# Altium schematic symbol library jlcpcb_2025_04_capacitors_extended_1206.schlib: 2503 symbols (part 7 of 14) (continued)
## CC1206JRNPOBBN680 (continued)

## CC1206JRNPOBBN681
designator C?  Capacitance: 680pF  (hidden comment: *)
Capacitor, Ceramic (MLCC), 680pF, ±5%, 500V, NP0, ±5%, SMD 1206; Manufacturer: YAGEO; Manufacturer Part Number: CC1206JRNPOBBN681; Package Size: 1206; JLCPCB Basic Part: No; JLCPCB Part Number: C577188; Supplier 1: LCSC; Category: Capacitors - MLCC; Supplier Part Number 1: C577188; Tolerance: ±5%; Voltage Rating: 500V; Temperature Coefficient: NP0; RoHS: Yes; ComponentLink1Description: Datasheet; ComponentLink1URL: https://wmsc.lcsc.com/wmsc/upload/file/pdf/v2/lcsc/2304140030_YAGEO-CC1206JRNPOBBN681_C577188.pdf; ComponentLink2Description: JLCPCB Part URL; ComponentLink2URL: https://jlcpcb.com/partdetail/C577188; ComponentLink3Description: LCSC Part URL; ComponentLink3URL: https://lcsc.com/product-detail/Multilayer-Ceramic-Capacitors-MLCC---SMD-SMT_YAGEO-YAGEO-CC1206JRNPOBBN681_C577188.html
footprint CAP-1206 (1206 (3216M) Capacitor)
pins: 1, 2

## CC1206JRNPOBBN820
designator C?  Capacitance: 82pF  (hidden comment: *)
Capacitor, Ceramic (MLCC), 82pF, ±5%, 500V, NP0, ±5%, SMD 1206; Manufacturer: YAGEO; Manufacturer Part Number: CC1206JRNPOBBN820; Package Size: 1206; JLCPCB Basic Part: No; JLCPCB Part Number: C527309; Supplier 1: LCSC; Category: Capacitors - MLCC; Supplier Part Number 1: C527309; Tolerance: ±5%; Voltage Rating: 500V; Temperature Coefficient: NP0; RoHS: Yes; ComponentLink1Description: Datasheet; ComponentLink1URL: https://wmsc.lcsc.com/wmsc/upload/file/pdf/v2/lcsc/2007221234_YAGEO-CC1206JRNPOBBN820_C527309.pdf; ComponentLink2Description: JLCPCB Part URL; ComponentLink2URL: https://jlcpcb.com/partdetail/C527309; ComponentLink3Description: LCSC Part URL; ComponentLink3URL: https://lcsc.com/product-detail/Multilayer-Ceramic-Capacitors-MLCC---SMD-SMT_YAGEO-YAGEO-CC1206JRNPOBBN820_C527309.html
footprint CAP-1206 (1206 (3216M) Capacitor)
pins: 1, 2

## CC1206JRNPOBBN821
designator C?  Capacitance: 820pF  (hidden comment: *)
Capacitor, Ceramic (MLCC), 820pF, ±5%, 500V, NP0, ±5%, SMD 1206; Manufacturer: YAGEO; Manufacturer Part Number: CC1206JRNPOBBN821; Package Size: 1206; JLCPCB Basic Part: No; JLCPCB Part Number: C527310; Supplier 1: LCSC; Category: Capacitors - MLCC; Supplier Part Number 1: C527310; Tolerance: ±5%; Voltage Rating: 500V; Temperature Coefficient: NP0; RoHS: Yes; ComponentLink1Description: Datasheet; ComponentLink1URL: https://wmsc.lcsc.com/wmsc/upload/file/pdf/v2/lcsc/2005222142_YAGEO-CC1206JRNPOBBN821_C527310.pdf; ComponentLink2Description: JLCPCB Part URL; ComponentLink2URL: https://jlcpcb.com/partdetail/C527310; ComponentLink3Description: LCSC Part URL; ComponentLink3URL: https://lcsc.com/product-detail/Multilayer-Ceramic-Capacitors-MLCC---SMD-SMT_YAGEO-YAGEO-CC1206JRNPOBBN821_C527310.html
footprint CAP-1206 (1206 (3216M) Capacitor)
pins: 1, 2

## CC1206JRNPOYBN101
designator C?  Capacitance: 100pF  (hidden comment: *)
Capacitor, Ceramic (MLCC), 100pF, ±5%, 250V, NP0, ±5%, SMD 1206; Manufacturer: YAGEO; Manufacturer Part Number: CC1206JRNPOYBN101; Package Size: 1206; JLCPCB Basic Part: No; JLCPCB Part Number: C527311; Supplier 1: LCSC; Category: Capacitors - MLCC; Supplier Part Number 1: C527311; Tolerance: ±5%; Voltage Rating: 250V; Temperature Coefficient: NP0; RoHS: Yes; ComponentLink1Description: Datasheet; ComponentLink1URL: https://wmsc.lcsc.com/wmsc/upload/file/pdf/v2/lcsc/2006101835_YAGEO-CC1206JRNPOYBN101_C527311.pdf; ComponentLink2Description: JLCPCB Part URL; ComponentLink2URL: https://jlcpcb.com/partdetail/C527311; ComponentLink3Description: LCSC Part URL; ComponentLink3URL: https://lcsc.com/product-detail/Multilayer-Ceramic-Capacitors-MLCC---SMD-SMT_YAGEO-YAGEO-CC1206JRNPOYBN101_C527311.html
footprint CAP-1206 (1206 (3216M) Capacitor)
pins: 1, 2

## CC1206JRNPOYBN151
designator C?  Capacitance: 150pF  (hidden comment: *)
Capacitor, Ceramic (MLCC), 150pF, ±5%, 250V, NP0, ±5%, SMD 1206; Manufacturer: YAGEO; Manufacturer Part Number: CC1206JRNPOYBN151; Package Size: 1206; JLCPCB Basic Part: No; JLCPCB Part Number: C577189; Supplier 1: LCSC; Category: Capacitors - MLCC; Supplier Part Number 1: C577189; Tolerance: ±5%; Voltage Rating: 250V; Temperature Coefficient: NP0; RoHS: Yes; ComponentLink1Description: Datasheet; ComponentLink1URL: https://wmsc.lcsc.com/wmsc/upload/file/pdf/v2/lcsc/2205191730_YAGEO-CC1206JRNPOYBN151_C577189.pdf; ComponentLink2Description: JLCPCB Part URL; ComponentLink2URL: https://jlcpcb.com/partdetail/C577189; ComponentLink3Description: LCSC Part URL; ComponentLink3URL: https://lcsc.com/product-detail/Multilayer-Ceramic-Capacitors-MLCC---SMD-SMT_YAGEO-YAGEO-CC1206JRNPOYBN151_C577189.html
footprint CAP-1206 (1206 (3216M) Capacitor)
pins: 1, 2

## CC1206JRNPOYBN471
designator C?  Capacitance: 470pF  (hidden comment: *)
Capacitor, Ceramic (MLCC), 470pF, ±5%, 250V, NP0, ±5%, SMD 1206; Manufacturer: YAGEO; Manufacturer Part Number: CC1206JRNPOYBN471; Package Size: 1206; JLCPCB Basic Part: No; JLCPCB Part Number: C326653; Supplier 1: LCSC; Category: Capacitors - MLCC; Supplier Part Number 1: C326653; Tolerance: ±5%; Voltage Rating: 250V; Temperature Coefficient: NP0; RoHS: Yes; ComponentLink1Description: Datasheet; ComponentLink1URL: https://wmsc.lcsc.com/wmsc/upload/file/pdf/v2/lcsc/1811141232_YAGEO-CC1206JRNPOYBN471_C326653.pdf; ComponentLink2Description: JLCPCB Part URL; ComponentLink2URL: https://jlcpcb.com/partdetail/C326653; ComponentLink3Description: LCSC Part URL; ComponentLink3URL: https://lcsc.com/product-detail/Multilayer-Ceramic-Capacitors-MLCC---SMD-SMT_YAGEO-YAGEO-CC1206JRNPOYBN471_C326653.html
footprint CAP-1206 (1206 (3216M) Capacitor)
pins: 1, 2

## CC1206JRNPOYBN681
designator C?  Capacitance: 680pF  (hidden comment: *)
Capacitor, Ceramic (MLCC), 680pF, ±5%, 250V, NP0, ±5%, SMD 1206; Manufacturer: YAGEO; Manufacturer Part Number: CC1206JRNPOYBN681; Package Size: 1206; JLCPCB Basic Part: No; JLCPCB Part Number: C527312; Supplier 1: LCSC; Category: Capacitors - MLCC; Supplier Part Number 1: C527312; Tolerance: ±5%; Voltage Rating: 250V; Temperature Coefficient: NP0; RoHS: Yes; ComponentLink1Description: Datasheet; ComponentLink1URL: https://wmsc.lcsc.com/wmsc/upload/file/pdf/v2/lcsc/2007021837_YAGEO-CC1206JRNPOYBN681_C527312.pdf; ComponentLink2Description: JLCPCB Part URL; ComponentLink2URL: https://jlcpcb.com/partdetail/C527312; ComponentLink3Description: LCSC Part URL; ComponentLink3URL: https://lcsc.com/product-detail/Multilayer-Ceramic-Capacitors-MLCC---SMD-SMT_YAGEO-YAGEO-CC1206JRNPOYBN681_C527312.html
footprint CAP-1206 (1206 (3216M) Capacitor)
pins: 1, 2

## CC1206JRX7R0BB102
designator C?  Capacitance: 1000pF  (hidden comment: *)
Capacitor, Ceramic (MLCC), 1000pF, ±5%, 100V, X7R, ±5%, SMD 1206; Manufacturer: YAGEO; Manufacturer Part Number: CC1206JRX7R0BB102; Package Size: 1206; JLCPCB Basic Part: No; JLCPCB Part Number: C577194; Supplier 1: LCSC; Category: Capacitors - MLCC; Supplier Part Number 1: C577194; Tolerance: ±5%; Voltage Rating: 100V; Temperature Coefficient: X7R; RoHS: Yes; ComponentLink1Description: Datasheet; ComponentLink1URL: https://wmsc.lcsc.com/wmsc/upload/file/pdf/v2/lcsc/2304281726_YAGEO-CC1206JRX7R0BB102_C577194.pdf; ComponentLink2Description: JLCPCB Part URL; ComponentLink2URL: https://jlcpcb.com/partdetail/C577194; ComponentLink3Description: LCSC Part URL; ComponentLink3URL: https://lcsc.com/product-detail/Multilayer-Ceramic-Capacitors-MLCC---SMD-SMT_YAGEO-YAGEO-CC1206JRX7R0BB102_C577194.html
footprint CAP-1206 (1206 (3216M) Capacitor)
pins: 1, 2

## CC1206JRX7R0BB103
designator C?  Capacitance: 10nF  (hidden comment: *)
Capacitor, Ceramic (MLCC), 10nF, ±5%, 100V, X7R, ±5%, SMD 1206; Manufacturer: YAGEO; Manufacturer Part Number: CC1206JRX7R0BB103; Package Size: 1206; JLCPCB Basic Part: No; JLCPCB Part Number: C364377; Supplier 1: LCSC; Category: Capacitors - MLCC; Supplier Part Number 1: C364377; Tolerance: ±5%; Voltage Rating: 100V; Temperature Coefficient: X7R; RoHS: Yes; ComponentLink1Description: Datasheet; ComponentLink1URL: https://wmsc.lcsc.com/wmsc/upload/file/pdf/v2/lcsc/1912111437_YAGEO-CC1206JRX7R0BB103_C364377.pdf; ComponentLink2Description: JLCPCB Part URL; ComponentLink2URL: https://jlcpcb.com/partdetail/C364377; ComponentLink3Description: LCSC Part URL; ComponentLink3URL: https://lcsc.com/product-detail/Multilayer-Ceramic-Capacitors-MLCC---SMD-SMT_YAGEO-YAGEO-CC1206JRX7R0BB103_C364377.html
footprint CAP-1206 (1206 (3216M) Capacitor)
pins: 1, 2

## CC1206JRX7R0BB153
designator C?  Capacitance: 15nF  (hidden comment: *)
Capacitor, Ceramic (MLCC), 15nF, ±5%, 100V, X7R, ±5%, SMD 1206; Manufacturer: YAGEO; Manufacturer Part Number: CC1206JRX7R0BB153; Package Size: 1206; JLCPCB Basic Part: No; JLCPCB Part Number: C527313; Supplier 1: LCSC; Category: Capacitors - MLCC; Supplier Part Number 1: C527313; Tolerance: ±5%; Voltage Rating: 100V; Temperature Coefficient: X7R; RoHS: Yes; ComponentLink1Description: Datasheet; ComponentLink1URL: https://wmsc.lcsc.com/wmsc/upload/file/pdf/v2/lcsc/2311211121_YAGEO-CC1206JRX7R0BB153_C527313.pdf; ComponentLink2Description: JLCPCB Part URL; ComponentLink2URL: https://jlcpcb.com/partdetail/C527313; ComponentLink3Description: LCSC Part URL; ComponentLink3URL: https://lcsc.com/product-detail/Multilayer-Ceramic-Capacitors-MLCC---SMD-SMT_YAGEO-YAGEO-CC1206JRX7R0BB153_C527313.html
footprint CAP-1206 (1206 (3216M) Capacitor)
pins: 1, 2

## CC1206JRX7R0BB222
designator C?  Capacitance: 2.2nF  (hidden comment: *)
Capacitor, Ceramic (MLCC), 2.2nF, ±5%, 100V, X7R, ±5%, SMD 1206; Manufacturer: YAGEO; Manufacturer Part Number: CC1206JRX7R0BB222; Package Size: 1206; JLCPCB Basic Part: No; JLCPCB Part Number: C527314; Supplier 1: LCSC; Category: Capacitors - MLCC; Supplier Part Number 1: C527314; Tolerance: ±5%; Voltage Rating: 100V; Temperature Coefficient: X7R; RoHS: Yes; ComponentLink1Description: Datasheet; ComponentLink1URL: https://wmsc.lcsc.com/wmsc/upload/file/pdf/v2/lcsc/2007091834_YAGEO-CC1206JRX7R0BB222_C527314.pdf; ComponentLink2Description: JLCPCB Part URL; ComponentLink2URL: https://jlcpcb.com/partdetail/C527314; ComponentLink3Description: LCSC Part URL; ComponentLink3URL: https://lcsc.com/product-detail/Multilayer-Ceramic-Capacitors-MLCC---SMD-SMT_YAGEO-YAGEO-CC1206JRX7R0BB222_C527314.html
footprint CAP-1206 (1206 (3216M) Capacitor)
pins: 1, 2

## CC1206JRX7R0BB333
designator C?  Capacitance: 33nF  (hidden comment: *)
Capacitor, Ceramic (MLCC), 33nF, ±5%, 100V, X7R, ±5%, SMD 1206; Manufacturer: YAGEO; Manufacturer Part Number: CC1206JRX7R0BB333; Package Size: 1206; JLCPCB Basic Part: No; JLCPCB Part Number: C527315; Supplier 1: LCSC; Category: Capacitors - MLCC; Supplier Part Number 1: C527315; Tolerance: ±5%; Voltage Rating: 100V; Temperature Coefficient: X7R; RoHS: Yes; ComponentLink1Description: Datasheet; ComponentLink1URL: https://wmsc.lcsc.com/wmsc/upload/file/pdf/v2/lcsc/2006241834_YAGEO-CC1206JRX7R0BB333_C527315.pdf; ComponentLink2Description: JLCPCB Part URL; ComponentLink2URL: https://jlcpcb.com/partdetail/C527315; ComponentLink3Description: LCSC Part URL; ComponentLink3URL: https://lcsc.com/product-detail/Multilayer-Ceramic-Capacitors-MLCC---SMD-SMT_YAGEO-YAGEO-CC1206JRX7R0BB333_C527315.html
footprint CAP-1206 (1206 (3216M) Capacitor)
pins: 1, 2

## CC1206JRX7R0BB472
designator C?  Capacitance: 4.7nF  (hidden comment: *)
Capacitor, Ceramic (MLCC), 4.7nF, ±5%, 100V, X7R, ±5%, SMD 1206; Manufacturer: YAGEO; Manufacturer Part Number: CC1206JRX7R0BB472; Package Size: 1206; JLCPCB Basic Part: No; JLCPCB Part Number: C326831; Supplier 1: LCSC; Category: Capacitors - MLCC; Supplier Part Number 1: C326831; Tolerance: ±5%; Voltage Rating: 100V; Temperature Coefficient: X7R; RoHS: Yes; ComponentLink1Description: Datasheet; ComponentLink1URL: https://wmsc.lcsc.com/wmsc/upload/file/pdf/v2/lcsc/1811151646_YAGEO-CC1206JRX7R0BB472_C326831.pdf; ComponentLink2Description: JLCPCB Part URL; ComponentLink2URL: https://jlcpcb.com/partdetail/C326831; ComponentLink3Description: LCSC Part URL; ComponentLink3URL: https://lcsc.com/product-detail/Multilayer-Ceramic-Capacitors-MLCC---SMD-SMT_YAGEO-YAGEO-CC1206JRX7R0BB472_C326831.html
footprint CAP-1206 (1206 (3216M) Capacitor)
pins: 1, 2

## CC1206JRX7R0BB473
designator C?  Capacitance: 47nF  (hidden comment: *)
Capacitor, Ceramic (MLCC), 47nF, ±5%, 100V, X7R, ±5%, SMD 1206; Manufacturer: YAGEO; Manufacturer Part Number: CC1206JRX7R0BB473; Package Size: 1206; JLCPCB Basic Part: No; JLCPCB Part Number: C577197; Supplier 1: LCSC; Category: Capacitors - MLCC; Supplier Part Number 1: C577197; Tolerance: ±5%; Voltage Rating: 100V; Temperature Coefficient: X7R; RoHS: Yes; ComponentLink1Description: Datasheet; ComponentLink1URL: https://wmsc.lcsc.com/wmsc/upload/file/pdf/v2/lcsc/2204121100_YAGEO-CC1206JRX7R0BB473_C577197.pdf; ComponentLink2Description: JLCPCB Part URL; ComponentLink2URL: https://jlcpcb.com/partdetail/C577197; ComponentLink3Description: LCSC Part URL; ComponentLink3URL: https://lcsc.com/product-detail/Multilayer-Ceramic-Capacitors-MLCC---SMD-SMT_YAGEO-YAGEO-CC1206JRX7R0BB473_C577197.html
footprint CAP-1206 (1206 (3216M) Capacitor)
pins: 1, 2

## CC1206JRX7R7BB224
designator C?  Capacitance: 220nF  (hidden comment: *)
Capacitor, Ceramic (MLCC), 220nF, ±5%, 16V, X7R, ±5%, SMD 1206; Manufacturer: YAGEO; Manufacturer Part Number: CC1206JRX7R7BB224; Package Size: 1206; JLCPCB Basic Part: No; JLCPCB Part Number: C527316; Supplier 1: LCSC; Category: Capacitors - MLCC; Supplier Part Number 1: C527316; Tolerance: ±5%; Voltage Rating: 16V; Temperature Coefficient: X7R; RoHS: Yes; ComponentLink1Description: Datasheet; ComponentLink1URL: https://wmsc.lcsc.com/wmsc/upload/file/pdf/v2/lcsc/2006101835_YAGEO-CC1206JRX7R7BB224_C527316.pdf; ComponentLink2Description: JLCPCB Part URL; ComponentLink2URL: https://jlcpcb.com/partdetail/C527316; ComponentLink3Description: LCSC Part URL; ComponentLink3URL: https://lcsc.com/product-detail/Multilayer-Ceramic-Capacitors-MLCC---SMD-SMT_YAGEO-YAGEO-CC1206JRX7R7BB224_C527316.html
footprint CAP-1206 (1206 (3216M) Capacitor)
pins: 1, 2

## CC1206JRX7R8BB104
designator C?  Capacitance: 100nF  (hidden comment: *)
Capacitor, Ceramic (MLCC), 100nF, ±5%, 25V, X7R, ±5%, SMD 1206; Manufacturer: YAGEO; Manufacturer Part Number: CC1206JRX7R8BB104; Package Size: 1206; JLCPCB Basic Part: No; JLCPCB Part Number: C541546; Supplier 1: LCSC; Category: Capacitors - MLCC; Supplier Part Number 1: C541546; Tolerance: ±5%; Voltage Rating: 25V; Temperature Coefficient: X7R; RoHS: Yes; ComponentLink1Description: Datasheet; ComponentLink1URL: https://wmsc.lcsc.com/wmsc/upload/file/pdf/v2/lcsc/2006151144_YAGEO-CC1206JRX7R8BB104_C541546.pdf; ComponentLink2Description: JLCPCB Part URL; ComponentLink2URL: https://jlcpcb.com/partdetail/C541546; ComponentLink3Description: LCSC Part URL; ComponentLink3URL: https://lcsc.com/product-detail/Multilayer-Ceramic-Capacitors-MLCC---SMD-SMT_YAGEO-YAGEO-CC1206JRX7R8BB104_C541546.html
footprint CAP-1206 (1206 (3216M) Capacitor)
pins: 1, 2

## CC1206JRX7R8BB224
designator C?  Capacitance: 220nF  (hidden comment: *)
Capacitor, Ceramic (MLCC), 220nF, ±5%, 25V, X7R, ±5%, SMD 1206; Manufacturer: YAGEO; Manufacturer Part Number: CC1206JRX7R8BB224; Package Size: 1206; JLCPCB Basic Part: No; JLCPCB Part Number: C541548; Supplier 1: LCSC; Category: Capacitors - MLCC; Supplier Part Number 1: C541548; Tolerance: ±5%; Voltage Rating: 25V; Temperature Coefficient: X7R; RoHS: Yes; ComponentLink1Description: Datasheet; ComponentLink1URL: https://wmsc.lcsc.com/wmsc/upload/file/pdf/v2/lcsc/2006151144_YAGEO-CC1206JRX7R8BB224_C541548.pdf; ComponentLink2Description: JLCPCB Part URL; ComponentLink2URL: https://jlcpcb.com/partdetail/C541548; ComponentLink3Description: LCSC Part URL; ComponentLink3URL: https://lcsc.com/product-detail/Multilayer-Ceramic-Capacitors-MLCC---SMD-SMT_YAGEO-YAGEO-CC1206JRX7R8BB224_C541548.html
footprint CAP-1206 (1206 (3216M) Capacitor)
pins: 1, 2

## CC1206JRX7R8BB474
designator C?  Capacitance: 470nF  (hidden comment: *)
Capacitor, Ceramic (MLCC), 470nF, ±5%, 25V, X7R, ±5%, SMD 1206; Manufacturer: YAGEO; Manufacturer Part Number: CC1206JRX7R8BB474; Package Size: 1206; JLCPCB Basic Part: No; JLCPCB Part Number: C541604; Supplier 1: LCSC; Category: Capacitors - MLCC; Supplier Part Number 1: C541604; Tolerance: ±5%; Voltage Rating: 25V; Temperature Coefficient: X7R; RoHS: Yes; ComponentLink1Description: Datasheet; ComponentLink1URL: https://wmsc.lcsc.com/wmsc/upload/file/pdf/v2/lcsc/2006151214_YAGEO-CC1206JRX7R8BB474_C541604.pdf; ComponentLink2Description: JLCPCB Part URL; ComponentLink2URL: https://jlcpcb.com/partdetail/C541604; ComponentLink3Description: LCSC Part URL; ComponentLink3URL: https://lcsc.com/product-detail/Multilayer-Ceramic-Capacitors-MLCC---SMD-SMT_YAGEO-YAGEO-CC1206JRX7R8BB474_C541604.html
footprint CAP-1206 (1206 (3216M) Capacitor)
pins: 1, 2

## CC1206JRX7R9BB102
designator C?  Capacitance: 1nF  (hidden comment: *)
Capacitor, Ceramic (MLCC), 1nF, ±5%, 50V, X7R, ±5%, SMD 1206; Manufacturer: YAGEO; Manufacturer Part Number: CC1206JRX7R9BB102; Package Size: 1206; JLCPCB Basic Part: No; JLCPCB Part Number: C541529; Supplier 1: LCSC; Category: Capacitors - MLCC; Supplier Part Number 1: C541529; Tolerance: ±5%; Voltage Rating: 50V; Temperature Coefficient: X7R; RoHS: Yes; ComponentLink1Description: Datasheet; ComponentLink1URL: https://wmsc.lcsc.com/wmsc/upload/file/pdf/v2/lcsc/2006151143_YAGEO-CC1206JRX7R9BB102_C541529.pdf; ComponentLink2Description: JLCPCB Part URL; ComponentLink2URL: https://jlcpcb.com/partdetail/C541529; ComponentLink3Description: LCSC Part URL; ComponentLink3URL: https://lcsc.com/product-detail/Multilayer-Ceramic-Capacitors-MLCC---SMD-SMT_YAGEO-YAGEO-CC1206JRX7R9BB102_C541529.html
footprint CAP-1206 (1206 (3216M) Capacitor)
pins: 1, 2

## CC1206JRX7R9BB103
designator C?  Capacitance: 10nF  (hidden comment: *)
Capacitor, Ceramic (MLCC), 10nF, ±5%, 50V, X7R, ±5%, SMD 1206; Manufacturer: YAGEO; Manufacturer Part Number: CC1206JRX7R9BB103; Package Size: 1206; JLCPCB Basic Part: No; JLCPCB Part Number: C309501; Supplier 1: LCSC; Category: Capacitors - MLCC; Supplier Part Number 1: C309501; Tolerance: ±5%; Voltage Rating: 50V; Temperature Coefficient: X7R; RoHS: Yes; ComponentLink1Description: Datasheet; ComponentLink1URL: https://wmsc.lcsc.com/wmsc/upload/file/pdf/v2/lcsc/2304140030_YAGEO-CC1206JRX7R9BB103_C309501.pdf; ComponentLink2Description: JLCPCB Part URL; ComponentLink2URL: https://jlcpcb.com/partdetail/C309501; ComponentLink3Description: LCSC Part URL; ComponentLink3URL: https://lcsc.com/product-detail/Multilayer-Ceramic-Capacitors-MLCC---SMD-SMT_YAGEO-YAGEO-CC1206JRX7R9BB103_C309501.html
footprint CAP-1206 (1206 (3216M) Capacitor)
pins: 1, 2

## CC1206JRX7R9BB104
designator C?  Capacitance: 100nF  (hidden comment: *)
Capacitor, Ceramic (MLCC), 100nF, ±5%, 50V, X7R, ±5%, SMD 1206; Manufacturer: YAGEO; Manufacturer Part Number: CC1206JRX7R9BB104; Package Size: 1206; JLCPCB Basic Part: No; JLCPCB Part Number: C541547; Supplier 1: LCSC; Category: Capacitors - MLCC; Supplier Part Number 1: C541547; Tolerance: ±5%; Voltage Rating: 50V; Temperature Coefficient: X7R; RoHS: Yes; ComponentLink1Description: Datasheet; ComponentLink1URL: https://wmsc.lcsc.com/wmsc/upload/file/pdf/v2/lcsc/2006151144_YAGEO-CC1206JRX7R9BB104_C541547.pdf; ComponentLink2Description: JLCPCB Part URL; ComponentLink2URL: https://jlcpcb.com/partdetail/C541547; ComponentLink3Description: LCSC Part URL; ComponentLink3URL: https://lcsc.com/product-detail/Multilayer-Ceramic-Capacitors-MLCC---SMD-SMT_YAGEO-YAGEO-CC1206JRX7R9BB104_C541547.html
footprint CAP-1206 (1206 (3216M) Capacitor)
pins: 1, 2

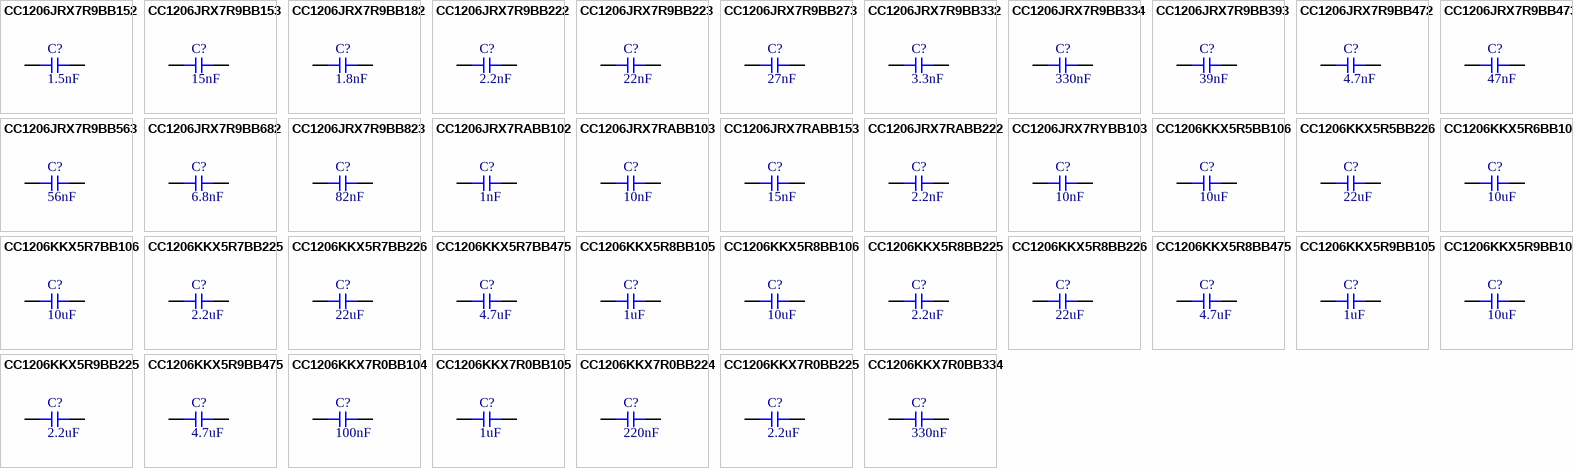
[diagram p29: symbols CC1206JRX7R9BB152 to CC1206KKX7R0BB334]

## CC1206JRX7R9BB152
designator C?  Capacitance: 1.5nF  (hidden comment: *)
Capacitor, Ceramic (MLCC), 1.5nF, ±5%, 50V, X7R, ±5%, SMD 1206; Manufacturer: YAGEO; Manufacturer Part Number: CC1206JRX7R9BB152; Package Size: 1206; JLCPCB Basic Part: No; JLCPCB Part Number: C527317; Supplier 1: LCSC; Category: Capacitors - MLCC; Supplier Part Number 1: C527317; Tolerance: ±5%; Voltage Rating: 50V; Temperature Coefficient: X7R; RoHS: Yes; ComponentLink1Description: Datasheet; ComponentLink1URL: https://wmsc.lcsc.com/wmsc/upload/file/pdf/v2/lcsc/2006181535_YAGEO-CC1206JRX7R9BB152_C527317.pdf; ComponentLink2Description: JLCPCB Part URL; ComponentLink2URL: https://jlcpcb.com/partdetail/C527317; ComponentLink3Description: LCSC Part URL; ComponentLink3URL: https://lcsc.com/product-detail/Multilayer-Ceramic-Capacitors-MLCC---SMD-SMT_YAGEO-YAGEO-CC1206JRX7R9BB152_C527317.html
footprint CAP-1206 (1206 (3216M) Capacitor)
pins: 1, 2

## CC1206JRX7R9BB153
designator C?  Capacitance: 15nF  (hidden comment: *)
Capacitor, Ceramic (MLCC), 15nF, ±5%, 50V, X7R, ±5%, SMD 1206; Manufacturer: YAGEO; Manufacturer Part Number: CC1206JRX7R9BB153; Package Size: 1206; JLCPCB Basic Part: No; JLCPCB Part Number: C541539; Supplier 1: LCSC; Category: Capacitors - MLCC; Supplier Part Number 1: C541539; Tolerance: ±5%; Voltage Rating: 50V; Temperature Coefficient: X7R; RoHS: Yes; ComponentLink1Description: Datasheet; ComponentLink1URL: https://wmsc.lcsc.com/wmsc/upload/file/pdf/v2/lcsc/2006151144_YAGEO-CC1206JRX7R9BB153_C541539.pdf; ComponentLink2Description: JLCPCB Part URL; ComponentLink2URL: https://jlcpcb.com/partdetail/C541539; ComponentLink3Description: LCSC Part URL; ComponentLink3URL: https://lcsc.com/product-detail/Multilayer-Ceramic-Capacitors-MLCC---SMD-SMT_YAGEO-YAGEO-CC1206JRX7R9BB153_C541539.html
footprint CAP-1206 (1206 (3216M) Capacitor)
pins: 1, 2

## CC1206JRX7R9BB182
designator C?  Capacitance: 1.8nF  (hidden comment: *)
Capacitor, Ceramic (MLCC), 1.8nF, ±5%, 50V, X7R, ±5%, SMD 1206; Manufacturer: YAGEO; Manufacturer Part Number: CC1206JRX7R9BB182; Package Size: 1206; JLCPCB Basic Part: No; JLCPCB Part Number: C527318; Supplier 1: LCSC; Category: Capacitors - MLCC; Supplier Part Number 1: C527318; Tolerance: ±5%; Voltage Rating: 50V; Temperature Coefficient: X7R; RoHS: Yes; ComponentLink1Description: Datasheet; ComponentLink1URL: https://wmsc.lcsc.com/wmsc/upload/file/pdf/v2/lcsc/2007091835_YAGEO-CC1206JRX7R9BB182_C527318.pdf; ComponentLink2Description: JLCPCB Part URL; ComponentLink2URL: https://jlcpcb.com/partdetail/C527318; ComponentLink3Description: LCSC Part URL; ComponentLink3URL: https://lcsc.com/product-detail/Multilayer-Ceramic-Capacitors-MLCC---SMD-SMT_YAGEO-YAGEO-CC1206JRX7R9BB182_C527318.html
footprint CAP-1206 (1206 (3216M) Capacitor)
pins: 1, 2

## CC1206JRX7R9BB222
designator C?  Capacitance: 2.2nF  (hidden comment: *)
Capacitor, Ceramic (MLCC), 2.2nF, ±5%, 50V, X7R, ±5%, SMD 1206; Manufacturer: YAGEO; Manufacturer Part Number: CC1206JRX7R9BB222; Package Size: 1206; JLCPCB Basic Part: No; JLCPCB Part Number: C527320; Supplier 1: LCSC; Category: Capacitors - MLCC; Supplier Part Number 1: C527320; Tolerance: ±5%; Voltage Rating: 50V; Temperature Coefficient: X7R; RoHS: Yes; ComponentLink1Description: Datasheet; ComponentLink1URL: https://wmsc.lcsc.com/wmsc/upload/file/pdf/v2/lcsc/2007091835_YAGEO-CC1206JRX7R9BB222_C527320.pdf; ComponentLink2Description: JLCPCB Part URL; ComponentLink2URL: https://jlcpcb.com/partdetail/C527320; ComponentLink3Description: LCSC Part URL; ComponentLink3URL: https://lcsc.com/product-detail/Multilayer-Ceramic-Capacitors-MLCC---SMD-SMT_YAGEO-YAGEO-CC1206JRX7R9BB222_C527320.html
footprint CAP-1206 (1206 (3216M) Capacitor)
pins: 1, 2

## CC1206JRX7R9BB223
designator C?  Capacitance: 22nF  (hidden comment: *)
Capacitor, Ceramic (MLCC), 22nF, ±5%, 50V, X7R, ±5%, SMD 1206; Manufacturer: YAGEO; Manufacturer Part Number: CC1206JRX7R9BB223; Package Size: 1206; JLCPCB Basic Part: No; JLCPCB Part Number: C527321; Supplier 1: LCSC; Category: Capacitors - MLCC; Supplier Part Number 1: C527321; Tolerance: ±5%; Voltage Rating: 50V; Temperature Coefficient: X7R; RoHS: Yes; ComponentLink1Description: Datasheet; ComponentLink1URL: https://wmsc.lcsc.com/wmsc/upload/file/pdf/v2/lcsc/2006101835_YAGEO-CC1206JRX7R9BB223_C527321.pdf; ComponentLink2Description: JLCPCB Part URL; ComponentLink2URL: https://jlcpcb.com/partdetail/C527321; ComponentLink3Description: LCSC Part URL; ComponentLink3URL: https://lcsc.com/product-detail/Multilayer-Ceramic-Capacitors-MLCC---SMD-SMT_YAGEO-YAGEO-CC1206JRX7R9BB223_C527321.html
footprint CAP-1206 (1206 (3216M) Capacitor)
pins: 1, 2

## CC1206JRX7R9BB273
designator C?  Capacitance: 27nF  (hidden comment: *)
Capacitor, Ceramic (MLCC), 27nF, ±5%, 50V, X7R, ±5%, SMD 1206; Manufacturer: YAGEO; Manufacturer Part Number: CC1206JRX7R9BB273; Package Size: 1206; JLCPCB Basic Part: No; JLCPCB Part Number: C541543; Supplier 1: LCSC; Category: Capacitors - MLCC; Supplier Part Number 1: C541543; Tolerance: ±5%; Voltage Rating: 50V; Temperature Coefficient: X7R; RoHS: Yes; ComponentLink1Description: Datasheet; ComponentLink1URL: https://wmsc.lcsc.com/wmsc/upload/file/pdf/v2/lcsc/2006151144_YAGEO-CC1206JRX7R9BB273_C541543.pdf; ComponentLink2Description: JLCPCB Part URL; ComponentLink2URL: https://jlcpcb.com/partdetail/C541543; ComponentLink3Description: LCSC Part URL; ComponentLink3URL: https://lcsc.com/product-detail/Multilayer-Ceramic-Capacitors-MLCC---SMD-SMT_YAGEO-YAGEO-CC1206JRX7R9BB273_C541543.html
footprint CAP-1206 (1206 (3216M) Capacitor)
pins: 1, 2

## CC1206JRX7R9BB332
designator C?  Capacitance: 3.3nF  (hidden comment: *)
Capacitor, Ceramic (MLCC), 3.3nF, ±5%, 50V, X7R, ±5%, SMD 1206; Manufacturer: YAGEO; Manufacturer Part Number: CC1206JRX7R9BB332; Package Size: 1206; JLCPCB Basic Part: No; JLCPCB Part Number: C541531; Supplier 1: LCSC; Category: Capacitors - MLCC; Supplier Part Number 1: C541531; Tolerance: ±5%; Voltage Rating: 50V; Temperature Coefficient: X7R; RoHS: Yes; ComponentLink1Description: Datasheet; ComponentLink1URL: https://wmsc.lcsc.com/wmsc/upload/file/pdf/v2/lcsc/2006151143_YAGEO-CC1206JRX7R9BB332_C541531.pdf; ComponentLink2Description: JLCPCB Part URL; ComponentLink2URL: https://jlcpcb.com/partdetail/C541531; ComponentLink3Description: LCSC Part URL; ComponentLink3URL: https://lcsc.com/product-detail/Multilayer-Ceramic-Capacitors-MLCC---SMD-SMT_YAGEO-YAGEO-CC1206JRX7R9BB332_C541531.html
footprint CAP-1206 (1206 (3216M) Capacitor)
pins: 1, 2

## CC1206JRX7R9BB334
designator C?  Capacitance: 330nF  (hidden comment: *)
Capacitor, Ceramic (MLCC), 330nF, ±5%, 50V, X7R, ±5%, SMD 1206; Manufacturer: YAGEO; Manufacturer Part Number: CC1206JRX7R9BB334; Package Size: 1206; JLCPCB Basic Part: No; JLCPCB Part Number: C577201; Supplier 1: LCSC; Category: Capacitors - MLCC; Supplier Part Number 1: C577201; Tolerance: ±5%; Voltage Rating: 50V; Temperature Coefficient: X7R; RoHS: Yes; ComponentLink1Description: Datasheet; ComponentLink1URL: https://wmsc.lcsc.com/wmsc/upload/file/pdf/v2/lcsc/2209061800_YAGEO-CC1206JRX7R9BB334_C577201.pdf; ComponentLink2Description: JLCPCB Part URL; ComponentLink2URL: https://jlcpcb.com/partdetail/C577201; ComponentLink3Description: LCSC Part URL; ComponentLink3URL: https://lcsc.com/product-detail/Multilayer-Ceramic-Capacitors-MLCC---SMD-SMT_YAGEO-YAGEO-CC1206JRX7R9BB334_C577201.html
footprint CAP-1206 (1206 (3216M) Capacitor)
pins: 1, 2

## CC1206JRX7R9BB393
designator C?  Capacitance: 39nF  (hidden comment: *)
Capacitor, Ceramic (MLCC), 39nF, ±5%, 50V, X7R, ±5%, SMD 1206; Manufacturer: YAGEO; Manufacturer Part Number: CC1206JRX7R9BB393; Package Size: 1206; JLCPCB Basic Part: No; JLCPCB Part Number: C541544; Supplier 1: LCSC; Category: Capacitors - MLCC; Supplier Part Number 1: C541544; Tolerance: ±5%; Voltage Rating: 50V; Temperature Coefficient: X7R; RoHS: Yes; ComponentLink1Description: Datasheet; ComponentLink1URL: https://wmsc.lcsc.com/wmsc/upload/file/pdf/v2/lcsc/2006151144_YAGEO-CC1206JRX7R9BB393_C541544.pdf; ComponentLink2Description: JLCPCB Part URL; ComponentLink2URL: https://jlcpcb.com/partdetail/C541544; ComponentLink3Description: LCSC Part URL; ComponentLink3URL: https://lcsc.com/product-detail/Multilayer-Ceramic-Capacitors-MLCC---SMD-SMT_YAGEO-YAGEO-CC1206JRX7R9BB393_C541544.html
footprint CAP-1206 (1206 (3216M) Capacitor)
pins: 1, 2

## CC1206JRX7R9BB472
designator C?  Capacitance: 4.7nF  (hidden comment: *)
Capacitor, Ceramic (MLCC), 4.7nF, ±5%, 50V, X7R, ±5%, SMD 1206; Manufacturer: YAGEO; Manufacturer Part Number: CC1206JRX7R9BB472; Package Size: 1206; JLCPCB Basic Part: No; JLCPCB Part Number: C527322; Supplier 1: LCSC; Category: Capacitors - MLCC; Supplier Part Number 1: C527322; Tolerance: ±5%; Voltage Rating: 50V; Temperature Coefficient: X7R; RoHS: Yes; ComponentLink1Description: Datasheet; ComponentLink1URL: https://wmsc.lcsc.com/wmsc/upload/file/pdf/v2/lcsc/2005222142_YAGEO-CC1206JRX7R9BB472_C527322.pdf; ComponentLink2Description: JLCPCB Part URL; ComponentLink2URL: https://jlcpcb.com/partdetail/C527322; ComponentLink3Description: LCSC Part URL; ComponentLink3URL: https://lcsc.com/product-detail/Multilayer-Ceramic-Capacitors-MLCC---SMD-SMT_YAGEO-YAGEO-CC1206JRX7R9BB472_C527322.html
footprint CAP-1206 (1206 (3216M) Capacitor)
pins: 1, 2

## CC1206JRX7R9BB473
designator C?  Capacitance: 47nF  (hidden comment: *)
Capacitor, Ceramic (MLCC), 47nF, ±5%, 50V, X7R, ±5%, SMD 1206; Manufacturer: YAGEO; Manufacturer Part Number: CC1206JRX7R9BB473; Package Size: 1206; JLCPCB Basic Part: No; JLCPCB Part Number: C527323; Supplier 1: LCSC; Category: Capacitors - MLCC; Supplier Part Number 1: C527323; Tolerance: ±5%; Voltage Rating: 50V; Temperature Coefficient: X7R; RoHS: Yes; ComponentLink1Description: Datasheet; ComponentLink1URL: https://wmsc.lcsc.com/wmsc/upload/file/pdf/v2/lcsc/2006031836_YAGEO-CC1206JRX7R9BB473_C527323.pdf; ComponentLink2Description: JLCPCB Part URL; ComponentLink2URL: https://jlcpcb.com/partdetail/C527323; ComponentLink3Description: LCSC Part URL; ComponentLink3URL: https://lcsc.com/product-detail/Multilayer-Ceramic-Capacitors-MLCC---SMD-SMT_YAGEO-YAGEO-CC1206JRX7R9BB473_C527323.html
footprint CAP-1206 (1206 (3216M) Capacitor)
pins: 1, 2

## CC1206JRX7R9BB563
designator C?  Capacitance: 56nF  (hidden comment: *)
Capacitor, Ceramic (MLCC), 56nF, ±5%, 50V, X7R, ±5%, SMD 1206; Manufacturer: YAGEO; Manufacturer Part Number: CC1206JRX7R9BB563; Package Size: 1206; JLCPCB Basic Part: No; JLCPCB Part Number: C527324; Supplier 1: LCSC; Category: Capacitors - MLCC; Supplier Part Number 1: C527324; Tolerance: ±5%; Voltage Rating: 50V; Temperature Coefficient: X7R; RoHS: Yes; ComponentLink1Description: Datasheet; ComponentLink1URL: https://wmsc.lcsc.com/wmsc/upload/file/pdf/v2/lcsc/2006101835_YAGEO-CC1206JRX7R9BB563_C527324.pdf; ComponentLink2Description: JLCPCB Part URL; ComponentLink2URL: https://jlcpcb.com/partdetail/C527324; ComponentLink3Description: LCSC Part URL; ComponentLink3URL: https://lcsc.com/product-detail/Multilayer-Ceramic-Capacitors-MLCC---SMD-SMT_YAGEO-YAGEO-CC1206JRX7R9BB563_C527324.html
footprint CAP-1206 (1206 (3216M) Capacitor)
pins: 1, 2

## CC1206JRX7R9BB682
designator C?  Capacitance: 6.8nF  (hidden comment: *)
Capacitor, Ceramic (MLCC), 6.8nF, ±5%, 50V, X7R, ±5%, SMD 1206; Manufacturer: YAGEO; Manufacturer Part Number: CC1206JRX7R9BB682; Package Size: 1206; JLCPCB Basic Part: No; JLCPCB Part Number: C527325; Supplier 1: LCSC; Category: Capacitors - MLCC; Supplier Part Number 1: C527325; Tolerance: ±5%; Voltage Rating: 50V; Temperature Coefficient: X7R; RoHS: Yes; ComponentLink1Description: Datasheet; ComponentLink1URL: https://wmsc.lcsc.com/wmsc/upload/file/pdf/v2/lcsc/2006101835_YAGEO-CC1206JRX7R9BB682_C527325.pdf; ComponentLink2Description: JLCPCB Part URL; ComponentLink2URL: https://jlcpcb.com/partdetail/C527325; ComponentLink3Description: LCSC Part URL; ComponentLink3URL: https://lcsc.com/product-detail/Multilayer-Ceramic-Capacitors-MLCC---SMD-SMT_YAGEO-YAGEO-CC1206JRX7R9BB682_C527325.html
footprint CAP-1206 (1206 (3216M) Capacitor)
pins: 1, 2

## CC1206JRX7R9BB823
designator C?  Capacitance: 82nF  (hidden comment: *)
Capacitor, Ceramic (MLCC), 82nF, ±5%, 50V, X7R, ±5%, SMD 1206; Manufacturer: YAGEO; Manufacturer Part Number: CC1206JRX7R9BB823; Package Size: 1206; JLCPCB Basic Part: No; JLCPCB Part Number: C541545; Supplier 1: LCSC; Category: Capacitors - MLCC; Supplier Part Number 1: C541545; Tolerance: ±5%; Voltage Rating: 50V; Temperature Coefficient: X7R; RoHS: Yes; ComponentLink1Description: Datasheet; ComponentLink1URL: https://wmsc.lcsc.com/wmsc/upload/file/pdf/v2/lcsc/2006151144_YAGEO-CC1206JRX7R9BB823_C541545.pdf; ComponentLink2Description: JLCPCB Part URL; ComponentLink2URL: https://jlcpcb.com/partdetail/C541545; ComponentLink3Description: LCSC Part URL; ComponentLink3URL: https://lcsc.com/product-detail/Multilayer-Ceramic-Capacitors-MLCC---SMD-SMT_YAGEO-YAGEO-CC1206JRX7R9BB823_C541545.html
footprint CAP-1206 (1206 (3216M) Capacitor)
pins: 1, 2

## CC1206JRX7RABB102
designator C?  Capacitance: 1nF  (hidden comment: *)
Capacitor, Ceramic (MLCC), 1nF, ±5%, 200V, X7R, ±5%, SMD 1206; Manufacturer: YAGEO; Manufacturer Part Number: CC1206JRX7RABB102; Package Size: 1206; JLCPCB Basic Part: No; JLCPCB Part Number: C527327; Supplier 1: LCSC; Category: Capacitors - MLCC; Supplier Part Number 1: C527327; Tolerance: ±5%; Voltage Rating: 200V; Temperature Coefficient: X7R; RoHS: Yes; ComponentLink1Description: Datasheet; ComponentLink1URL: https://wmsc.lcsc.com/wmsc/upload/file/pdf/v2/lcsc/2007021837_YAGEO-CC1206JRX7RABB102_C527327.pdf; ComponentLink2Description: JLCPCB Part URL; ComponentLink2URL: https://jlcpcb.com/partdetail/C527327; ComponentLink3Description: LCSC Part URL; ComponentLink3URL: https://lcsc.com/product-detail/Multilayer-Ceramic-Capacitors-MLCC---SMD-SMT_YAGEO-YAGEO-CC1206JRX7RABB102_C527327.html
footprint CAP-1206 (1206 (3216M) Capacitor)
pins: 1, 2

## CC1206JRX7RABB103
designator C?  Capacitance: 10nF  (hidden comment: *)
Capacitor, Ceramic (MLCC), 10nF, ±5%, 200V, X7R, ±5%, SMD 1206; Manufacturer: YAGEO; Manufacturer Part Number: CC1206JRX7RABB103; Package Size: 1206; JLCPCB Basic Part: No; JLCPCB Part Number: C527328; Supplier 1: LCSC; Category: Capacitors - MLCC; Supplier Part Number 1: C527328; Tolerance: ±5%; Voltage Rating: 200V; Temperature Coefficient: X7R; RoHS: Yes; ComponentLink1Description: Datasheet; ComponentLink1URL: https://wmsc.lcsc.com/wmsc/upload/file/pdf/v2/lcsc/2006181535_YAGEO-CC1206JRX7RABB103_C527328.pdf; ComponentLink2Description: JLCPCB Part URL; ComponentLink2URL: https://jlcpcb.com/partdetail/C527328; ComponentLink3Description: LCSC Part URL; ComponentLink3URL: https://lcsc.com/product-detail/Multilayer-Ceramic-Capacitors-MLCC---SMD-SMT_YAGEO-YAGEO-CC1206JRX7RABB103_C527328.html
footprint CAP-1206 (1206 (3216M) Capacitor)
pins: 1, 2

## CC1206JRX7RABB153
designator C?  Capacitance: 15nF  (hidden comment: *)
Capacitor, Ceramic (MLCC), 15nF, ±5%, 200V, X7R, ±5%, SMD 1206; Manufacturer: YAGEO; Manufacturer Part Number: CC1206JRX7RABB153; Package Size: 1206; JLCPCB Basic Part: No; JLCPCB Part Number: C527329; Supplier 1: LCSC; Category: Capacitors - MLCC; Supplier Part Number 1: C527329; Tolerance: ±5%; Voltage Rating: 200V; Temperature Coefficient: X7R; RoHS: Yes; ComponentLink1Description: Datasheet; ComponentLink1URL: https://wmsc.lcsc.com/wmsc/upload/file/pdf/v2/lcsc/2007091835_YAGEO-CC1206JRX7RABB153_C527329.pdf; ComponentLink2Description: JLCPCB Part URL; ComponentLink2URL: https://jlcpcb.com/partdetail/C527329; ComponentLink3Description: LCSC Part URL; ComponentLink3URL: https://lcsc.com/product-detail/Multilayer-Ceramic-Capacitors-MLCC---SMD-SMT_YAGEO-YAGEO-CC1206JRX7RABB153_C527329.html
footprint CAP-1206 (1206 (3216M) Capacitor)
pins: 1, 2

## CC1206JRX7RABB222
designator C?  Capacitance: 2.2nF  (hidden comment: *)
Capacitor, Ceramic (MLCC), 2.2nF, ±5%, 200V, X7R, ±5%, SMD 1206; Manufacturer: YAGEO; Manufacturer Part Number: CC1206JRX7RABB222; Package Size: 1206; JLCPCB Basic Part: No; JLCPCB Part Number: C527330; Supplier 1: LCSC; Category: Capacitors - MLCC; Supplier Part Number 1: C527330; Tolerance: ±5%; Voltage Rating: 200V; Temperature Coefficient: X7R; RoHS: Yes; ComponentLink1Description: Datasheet; ComponentLink1URL: https://wmsc.lcsc.com/wmsc/upload/file/pdf/v2/lcsc/2007021837_YAGEO-CC1206JRX7RABB222_C527330.pdf; ComponentLink2Description: JLCPCB Part URL; ComponentLink2URL: https://jlcpcb.com/partdetail/C527330; ComponentLink3Description: LCSC Part URL; ComponentLink3URL: https://lcsc.com/product-detail/Multilayer-Ceramic-Capacitors-MLCC---SMD-SMT_YAGEO-YAGEO-CC1206JRX7RABB222_C527330.html
footprint CAP-1206 (1206 (3216M) Capacitor)
pins: 1, 2

## CC1206JRX7RYBB103
designator C?  Capacitance: 10nF  (hidden comment: *)
Capacitor, Ceramic (MLCC), 10nF, ±5%, 250V, X7R, ±5%, SMD 1206; Manufacturer: YAGEO; Manufacturer Part Number: CC1206JRX7RYBB103; Package Size: 1206; JLCPCB Basic Part: No; JLCPCB Part Number: C527331; Supplier 1: LCSC; Category: Capacitors - MLCC; Supplier Part Number 1: C527331; Tolerance: ±5%; Voltage Rating: 250V; Temperature Coefficient: X7R; RoHS: Yes; ComponentLink1Description: Datasheet; ComponentLink1URL: https://wmsc.lcsc.com/wmsc/upload/file/pdf/v2/lcsc/2007021837_YAGEO-CC1206JRX7RYBB103_C527331.pdf; ComponentLink2Description: JLCPCB Part URL; ComponentLink2URL: https://jlcpcb.com/partdetail/C527331; ComponentLink3Description: LCSC Part URL; ComponentLink3URL: https://lcsc.com/product-detail/Multilayer-Ceramic-Capacitors-MLCC---SMD-SMT_YAGEO-YAGEO-CC1206JRX7RYBB103_C527331.html
footprint CAP-1206 (1206 (3216M) Capacitor)
pins: 1, 2

## CC1206KKX5R5BB106
designator C?  Capacitance: 10uF  (hidden comment: *)
Capacitor, Ceramic (MLCC), 10uF, ±10%, 6.3V, X5R, ±10%, SMD 1206; Manufacturer: YAGEO; Manufacturer Part Number: CC1206KKX5R5BB106; Package Size: 1206; JLCPCB Basic Part: No; JLCPCB Part Number: C726631; Supplier 1: LCSC; Category: Capacitors - MLCC; Supplier Part Number 1: C726631; Tolerance: ±10%; Voltage Rating: 6.3V; Temperature Coefficient: X5R; RoHS: Yes; ComponentLink1Description: Datasheet; ComponentLink1URL: https://wmsc.lcsc.com/wmsc/upload/file/pdf/v2/lcsc/2407081117_YAGEO-CC1206KKX5R5BB106_C726631.pdf; ComponentLink2Description: JLCPCB Part URL; ComponentLink2URL: https://jlcpcb.com/partdetail/C726631; ComponentLink3Description: LCSC Part URL; ComponentLink3URL: https://lcsc.com/product-detail/Multilayer-Ceramic-Capacitors-MLCC---SMD-SMT_YAGEO-YAGEO-CC1206KKX5R5BB106_C726631.html
footprint CAP-1206 (1206 (3216M) Capacitor)
pins: 1, 2

## CC1206KKX5R5BB226
designator C?  Capacitance: 22uF  (hidden comment: *)
Capacitor, Ceramic (MLCC), 22uF, ±10%, 6.3V, X5R, ±10%, SMD 1206; Manufacturer: YAGEO; Manufacturer Part Number: CC1206KKX5R5BB226; Package Size: 1206; JLCPCB Basic Part: No; JLCPCB Part Number: C513608; Supplier 1: LCSC; Category: Capacitors - MLCC; Supplier Part Number 1: C513608; Tolerance: ±10%; Voltage Rating: 6.3V; Temperature Coefficient: X5R; RoHS: Yes; ComponentLink1Description: Datasheet; ComponentLink1URL: https://wmsc.lcsc.com/wmsc/upload/file/pdf/v2/lcsc/2407081117_YAGEO-CC1206KKX5R5BB226_C513608.pdf; ComponentLink2Description: JLCPCB Part URL; ComponentLink2URL: https://jlcpcb.com/partdetail/C513608; ComponentLink3Description: LCSC Part URL; ComponentLink3URL: https://lcsc.com/product-detail/Multilayer-Ceramic-Capacitors-MLCC---SMD-SMT_YAGEO-YAGEO-CC1206KKX5R5BB226_C513608.html
footprint CAP-1206 (1206 (3216M) Capacitor)
pins: 1, 2

## CC1206KKX5R6BB106
designator C?  Capacitance: 10uF  (hidden comment: *)
Capacitor, Ceramic (MLCC), 10uF, ±10%, 10V, X5R, ±10%, SMD 1206; Manufacturer: YAGEO; Manufacturer Part Number: CC1206KKX5R6BB106; Package Size: 1206; JLCPCB Basic Part: No; JLCPCB Part Number: C527332; Supplier 1: LCSC; Category: Capacitors - MLCC; Supplier Part Number 1: C527332; Tolerance: ±10%; Voltage Rating: 10V; Temperature Coefficient: X5R; RoHS: Yes; ComponentLink1Description: Datasheet; ComponentLink1URL: https://wmsc.lcsc.com/wmsc/upload/file/pdf/v2/lcsc/2407081117_YAGEO-CC1206KKX5R6BB106_C527332.pdf; ComponentLink2Description: JLCPCB Part URL; ComponentLink2URL: https://jlcpcb.com/partdetail/C527332; ComponentLink3Description: LCSC Part URL; ComponentLink3URL: https://lcsc.com/product-detail/Multilayer-Ceramic-Capacitors-MLCC---SMD-SMT_YAGEO-YAGEO-CC1206KKX5R6BB106_C527332.html
footprint CAP-1206 (1206 (3216M) Capacitor)
pins: 1, 2

## CC1206KKX5R7BB106
designator C?  Capacitance: 10uF  (hidden comment: *)
Capacitor, Ceramic (MLCC), 10uF, ±10%, 16V, X5R, ±10%, SMD 1206; Manufacturer: YAGEO; Manufacturer Part Number: CC1206KKX5R7BB106; Package Size: 1206; JLCPCB Basic Part: No; JLCPCB Part Number: C128857; Supplier 1: LCSC; Category: Capacitors - MLCC; Supplier Part Number 1: C128857; Tolerance: ±10%; Voltage Rating: 16V; Temperature Coefficient: X5R; RoHS: Yes; ComponentLink1Description: Datasheet; ComponentLink1URL: https://wmsc.lcsc.com/wmsc/upload/file/pdf/v2/lcsc/2407081117_YAGEO-CC1206KKX5R7BB106_C128857.pdf; ComponentLink2Description: JLCPCB Part URL; ComponentLink2URL: https://jlcpcb.com/partdetail/C128857; ComponentLink3Description: LCSC Part URL; ComponentLink3URL: https://lcsc.com/product-detail/Multilayer-Ceramic-Capacitors-MLCC---SMD-SMT_YAGEO-YAGEO-CC1206KKX5R7BB106_C128857.html
footprint CAP-1206 (1206 (3216M) Capacitor)
pins: 1, 2

## CC1206KKX5R7BB225
designator C?  Capacitance: 2.2uF  (hidden comment: *)
Capacitor, Ceramic (MLCC), 2.2uF, ±10%, 16V, X5R, ±10%, SMD 1206; Manufacturer: YAGEO; Manufacturer Part Number: CC1206KKX5R7BB225; Package Size: 1206; JLCPCB Basic Part: No; JLCPCB Part Number: C326609; Supplier 1: LCSC; Category: Capacitors - MLCC; Supplier Part Number 1: C326609; Tolerance: ±10%; Voltage Rating: 16V; Temperature Coefficient: X5R; RoHS: Yes; ComponentLink1Description: Datasheet; ComponentLink1URL: https://wmsc.lcsc.com/wmsc/upload/file/pdf/v2/lcsc/2407081117_YAGEO-CC1206KKX5R7BB225_C326609.pdf; ComponentLink2Description: JLCPCB Part URL; ComponentLink2URL: https://jlcpcb.com/partdetail/C326609; ComponentLink3Description: LCSC Part URL; ComponentLink3URL: https://lcsc.com/product-detail/Multilayer-Ceramic-Capacitors-MLCC---SMD-SMT_YAGEO-YAGEO-CC1206KKX5R7BB225_C326609.html
footprint CAP-1206 (1206 (3216M) Capacitor)
pins: 1, 2

## CC1206KKX5R7BB226
designator C?  Capacitance: 22uF  (hidden comment: *)
Capacitor, Ceramic (MLCC), 22uF, ±10%, 16V, X5R, ±10%, SMD 1206; Manufacturer: YAGEO; Manufacturer Part Number: CC1206KKX5R7BB226; Package Size: 1206; JLCPCB Basic Part: No; JLCPCB Part Number: C1952615; Supplier 1: LCSC; Category: Capacitors - MLCC; Supplier Part Number 1: C1952615; Tolerance: ±10%; Voltage Rating: 16V; Temperature Coefficient: X5R; RoHS: Yes; ComponentLink1Description: Datasheet; ComponentLink1URL: https://wmsc.lcsc.com/wmsc/upload/file/pdf/v2/lcsc/2407081117_YAGEO-CC1206KKX5R7BB226_C1952615.pdf; ComponentLink2Description: JLCPCB Part URL; ComponentLink2URL: https://jlcpcb.com/partdetail/C1952615; ComponentLink3Description: LCSC Part URL; ComponentLink3URL: https://lcsc.com/product-detail/Multilayer-Ceramic-Capacitors-MLCC---SMD-SMT_YAGEO-YAGEO-CC1206KKX5R7BB226_C1952615.html
footprint CAP-1206 (1206 (3216M) Capacitor)
pins: 1, 2

## CC1206KKX5R7BB475
designator C?  Capacitance: 4.7uF  (hidden comment: *)
Capacitor, Ceramic (MLCC), 4.7uF, ±10%, 16V, X5R, ±10%, SMD 1206; Manufacturer: YAGEO; Manufacturer Part Number: CC1206KKX5R7BB475; Package Size: 1206; JLCPCB Basic Part: No; JLCPCB Part Number: C577206; Supplier 1: LCSC; Category: Capacitors - MLCC; Supplier Part Number 1: C577206; Tolerance: ±10%; Voltage Rating: 16V; Temperature Coefficient: X5R; RoHS: Yes; ComponentLink1Description: Datasheet; ComponentLink1URL: https://wmsc.lcsc.com/wmsc/upload/file/pdf/v2/lcsc/2407081117_YAGEO-CC1206KKX5R7BB475_C577206.pdf; ComponentLink2Description: JLCPCB Part URL; ComponentLink2URL: https://jlcpcb.com/partdetail/C577206; ComponentLink3Description: LCSC Part URL; ComponentLink3URL: https://lcsc.com/product-detail/Multilayer-Ceramic-Capacitors-MLCC---SMD-SMT_YAGEO-YAGEO-CC1206KKX5R7BB475_C577206.html
footprint CAP-1206 (1206 (3216M) Capacitor)
pins: 1, 2

## CC1206KKX5R8BB105
designator C?  Capacitance: 1uF  (hidden comment: *)
Capacitor, Ceramic (MLCC), 1uF, ±10%, 25V, X5R, ±10%, SMD 1206; Manufacturer: YAGEO; Manufacturer Part Number: CC1206KKX5R8BB105; Package Size: 1206; JLCPCB Basic Part: No; JLCPCB Part Number: C309502; Supplier 1: LCSC; Category: Capacitors - MLCC; Supplier Part Number 1: C309502; Tolerance: ±10%; Voltage Rating: 25V; Temperature Coefficient: X5R; RoHS: Yes; ComponentLink1Description: Datasheet; ComponentLink1URL: https://wmsc.lcsc.com/wmsc/upload/file/pdf/v2/lcsc/2407081117_YAGEO-CC1206KKX5R8BB105_C309502.pdf; ComponentLink2Description: JLCPCB Part URL; ComponentLink2URL: https://jlcpcb.com/partdetail/C309502; ComponentLink3Description: LCSC Part URL; ComponentLink3URL: https://lcsc.com/product-detail/Multilayer-Ceramic-Capacitors-MLCC---SMD-SMT_YAGEO-YAGEO-CC1206KKX5R8BB105_C309502.html
footprint CAP-1206 (1206 (3216M) Capacitor)
pins: 1, 2
